# Altium footprint library PCB1.PcbLib: 98 footprints (part 2 of 7)
Each footprint in its own frame and in the unit in brackets; x right, y up, seen from the top. Pads: shape width x height; smd on the part's side, far side on the other; paste and mask are expansions set on the pad; w line width, h text height; cw(c..) or ccw(c..) is an arc to the next point about the centre after c.
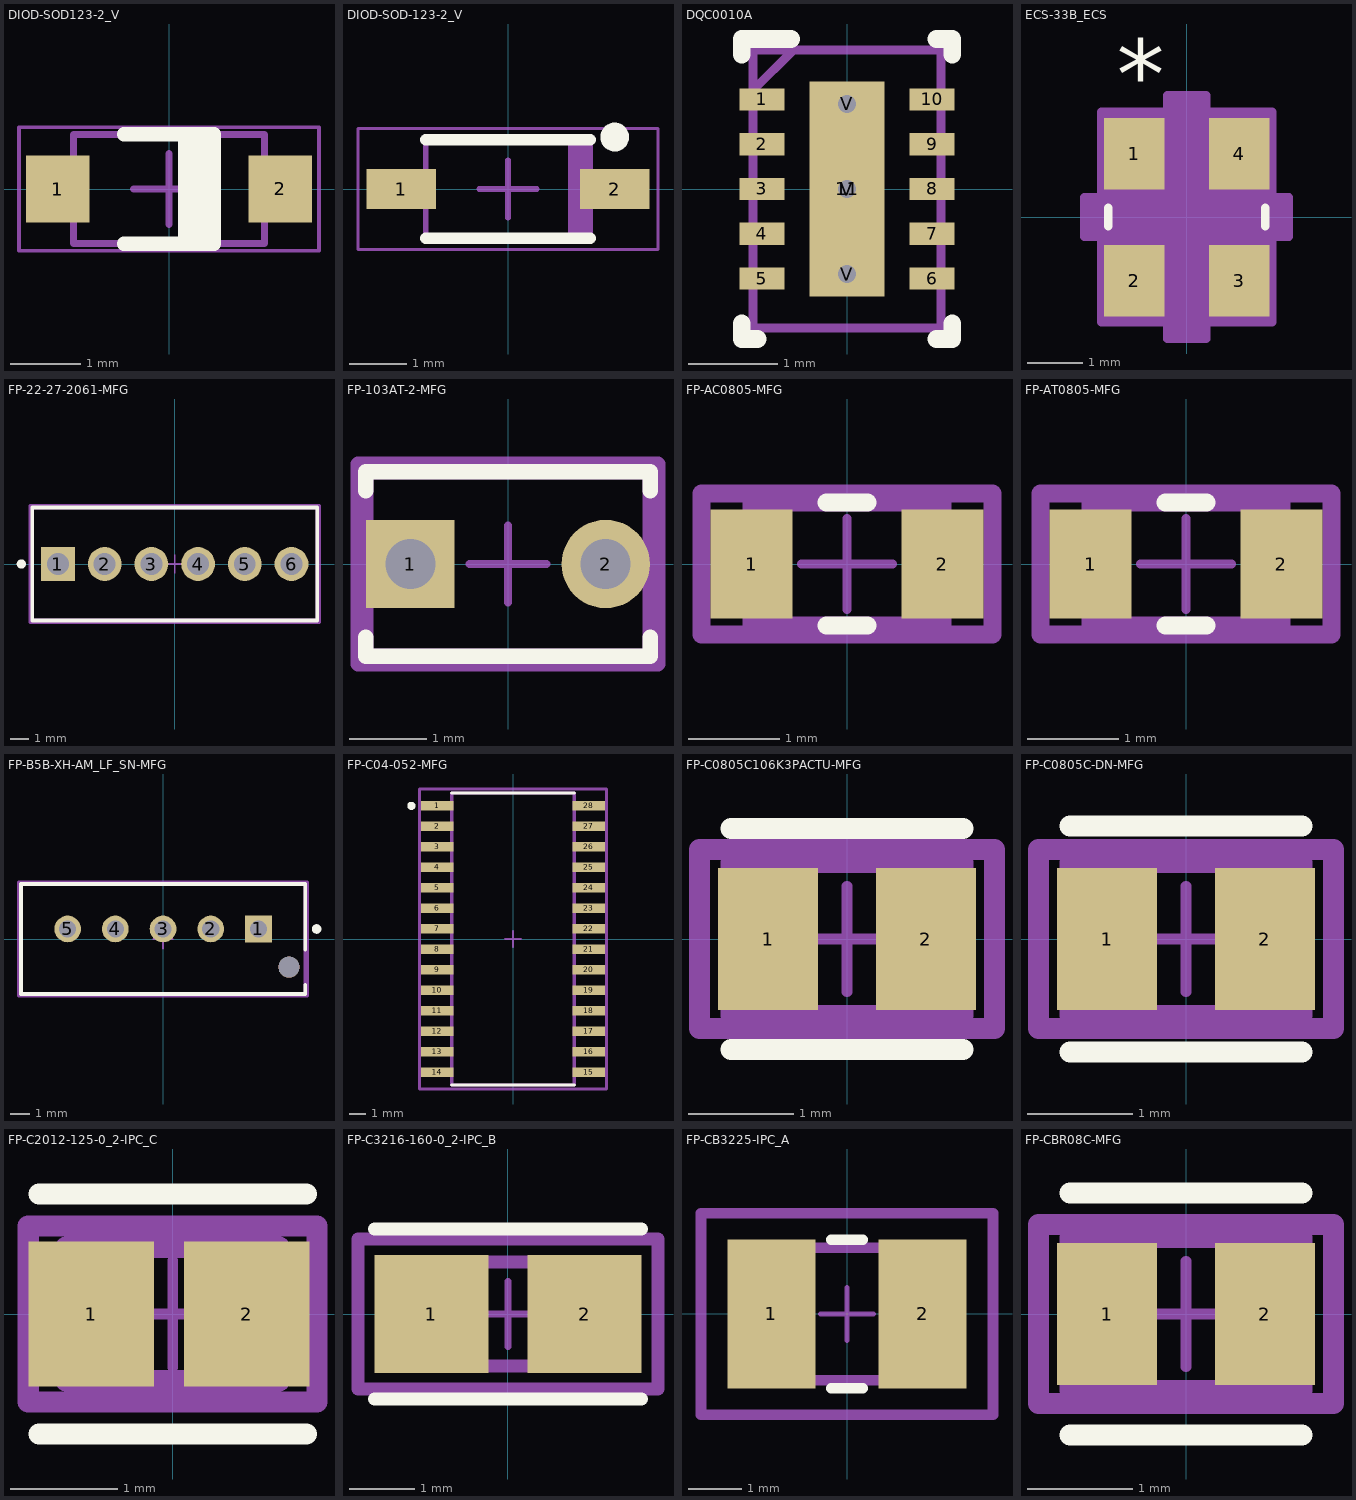
[diagram p1: the footprints below, top view; thin cyan lines are the x and y axes]

## DIOD-SOD123-2_V [mm]
pads (2):
  rect 0.9x0.95 smd: 1(-1.575,0) 2(1.575,0)
Top Overlay:
  rectangle: 0.127,-0.825 0.635,0.762
  lines w0.2: -0.635,-0.775 0.635,-0.775 0.635,0.775 -0.635,0.775
Top 3D Body:
  lines w0.1: -1.35,-0.775 1.35,-0.775 1.35,0.775 -1.35,0.775 -1.35,-0.775
Top Courtyard:
  lines w0.05: -2.125,-0.875 2.125,-0.875 2.125,0.875 -2.125,0.875 -2.125,-0.875
  lines w0.1: -0.5,0 0.5,0 ; 0,-0.5 0,0.5
3D body: height 1.45, standoff 0, extent -1.35,-0.775 1.35,0.775

## DIOD-SOD-123-2_V [mm]
pads (2):
  rect 1.2x0.7 smd: 1(-1.85,0) 2(1.85,0)
Top Overlay:
  circle w0.25: c1.85,0.9 r0.125
  lines w0.2: -1.425,-0.85 1.425,-0.85 ; -1.425,0.85 1.425,0.85
Top 3D Body:
  rectangle: 1.042,-0.85 1.425,0.85
  lines w0.1: -1.425,-0.85 1.425,-0.85 1.425,0.85 -1.425,0.85 -1.425,-0.85
Top Courtyard:
  lines w0.05: -2.6,-1.05 2.6,-1.05 2.6,1.05 -2.6,1.05 -2.6,-1.05
  lines w0.1: -0.5,0 0.5,0 ; 0,-0.5 0,0.5
3D body: height 1.45, standoff 0, extent -1.425,-0.85 1.425,0.85

## DQC0010A [mm]
pads (14):
  rect 0.5x0.25 smd paste+0 mask+0.051: 1(-0.95,1) 2(-0.95,0.5) 3(-0.95,0) 4(-0.95,-0.5) 5(-0.95,-1) 6(0.95,-1) 7(0.95,-0.5) 8(0.95,0) 9(0.95,0.5) 10(0.95,1)
  rect 0.84x2.4 smd paste-0.42 mask+0.051: 11(0,0)
  round 0.5 hole 0.203 paste-2539.97 mask+0.051: V(0,-0.95) V(0,0) V(0,0.95)
Top Overlay:
  lines w0.2: -1.175,-1.5 -1.175,-1.675 -1,-1.675 ; -1.175,1.5 -1.175,1.675 -0.625,1.675 ; 1,-1.675 1.175,-1.675 1.175,-1.5 ; 1,1.675 1.175,1.675 1.175,1.5
Top Paste:
  region: -0.399,0.139 -0.4,0.148 -0.4,1.132 -0.399,1.141 -0.396,1.15 -0.392,1.159 -0.386,1.166 -0.379,1.172 -0.37,1.176 -0.361,1.179 -0.352,1.18 0.352,1.18 0.361,1.179 0.37,1.176 0.379,1.172 0.386,1.166 0.392,1.159 0.396,1.15 0.399,1.141 0.4,1.132 0.4,0.148 0.399,0.139 0.396,0.13 0.392,0.121 0.386,0.114 0.379,0.108 0.37,0.104 0.361,0.101 0.352,0.1 -0.352,0.1 -0.361,0.101 -0.37,0.104 -0.379,0.108 -0.386,0.114 -0.392,0.121 -0.396,0.13
  region: -0.399,-1.141 -0.4,-1.132 -0.4,-0.148 -0.399,-0.139 -0.396,-0.13 -0.392,-0.121 -0.386,-0.114 -0.379,-0.108 -0.37,-0.104 -0.361,-0.101 -0.352,-0.1 0.352,-0.1 0.361,-0.101 0.37,-0.104 0.379,-0.108 0.386,-0.114 0.392,-0.121 0.396,-0.13 0.399,-0.139 0.4,-0.148 0.4,-1.132 0.399,-1.141 0.396,-1.15 0.392,-1.159 0.386,-1.166 0.379,-1.172 0.37,-1.176 0.361,-1.179 0.352,-1.18 -0.352,-1.18 -0.361,-1.179 -0.37,-1.176 -0.379,-1.172 -0.386,-1.166 -0.392,-1.159 -0.396,-1.15
Top 3D Body:
  lines w0.1: -1.05,1.1 -0.6,1.55 ; -1.05,-1.55 1.05,-1.55 1.05,1.55 -1.05,1.55 -1.05,-1.55
3D body "TPS62177DQCR.step": height 0.8, standoff 0, extent -1,-1.5 1,1.5

## ECS-33B_ECS [mm]
pads (4):
  rect 1.092x1.295 smd paste+0 mask+0: 1(-0.95,1.15) 2(-0.95,-1.15) 3(0.95,-1.15) 4(0.95,1.15)
Top Overlay:
  lines w0.152: -1.422,-0.17 -1.422,0.17 ; 1.422,-0.17 1.422,0.17
  text "*" at -1.268,1.956 h1.27
Top 3D Body:
  lines w0.025: -1.295,0.381 -0.025,1.651 ; -1.295,-1.651 -1.295,1.651 1.295,1.651 1.295,-1.651 -1.295,-1.651
Top Courtyard:
  region: -0.381,-1.905 -1.575,-1.905 -1.575,-0.356 -1.88,-0.356 -1.88,0.356 -1.575,0.356 -1.575,1.905 -0.381,1.905 -0.381,2.21 0.33,2.21 0.33,1.905 1.524,1.905 1.524,0.356 1.829,0.356 1.829,-0.356 1.524,-0.356 1.524,-1.905 0.33,-1.905 0.33,-2.21 -0.381,-2.21
  lines w0.152: -1.854,-0.356 -1.854,0.356 -1.549,0.356 -1.549,1.905 -0.356,1.905 -0.356,2.21 0.356,2.21 0.356,1.905 1.549,1.905 1.549,0.356 1.854,0.356 1.854,-0.356 1.549,-0.356 1.549,-1.905 0.356,-1.905 0.356,-2.21 -0.356,-2.21 -0.356,-1.905 -1.549,-1.905 -1.549,-0.356 -1.854,-0.356
3D body "ECS-320-8-33B-7KM-TR.STEP": height 0.8, standoff 0, extent -1.25,-1.6 1.25,1.6

## FP-22-27-2061-MFG [mm]
pads (6):
  rect 1.84x1.84 hole 1.19 paste-2539.97 mask+0: 1(-6.35,0)
  round 1.84 hole 1.19 paste-2539.97 mask+0: 2(-3.81,0) 3(-1.27,0) 4(1.27,0) 5(3.81,0) 6(6.35,0)
Top Overlay:
  circle w0.25: c-8.345,0 r0.125
  lines w0.2: -7.745,-3.075 -7.745,3.075 7.745,3.075 7.745,-3.075 -7.745,-3.075
Top Assembly:
  lines w0.2: -7.845,-3.175 7.845,-3.175 7.845,3.175 -7.845,3.175 -7.845,-3.175
Top 3D Body:
  lines w0.2: -7.745,-3.075 7.745,-3.075 7.745,3.075 -7.745,3.075 -7.745,-3.075
Top Courtyard:
  lines w0.2: -7.845,-3.175 7.845,-3.175 7.845,3.175 -7.845,3.175 -7.845,-3.175
Top Component Center:
  lines w0.1: -0.5,0 0.5,0 ; 0,-0.5 0,0.5
3D body "Conn_Molex_22-27-2061_eec.STEP": height 12.05, standoff -3.56, extent -7.623,-2.9 7.62,2.901

## FP-103AT-2-MFG [mm]
pads (2):
  rect 1.15x1.15 hole 0.65 paste-2539.97 mask+0: 1(-1.27,0)
  round 1.15 hole 0.65 paste-2539.97 mask+0: 2(1.27,0)
Top Overlay:
  lines w0.2: -1.85,-0.95 -1.85,-1.2 1.85,-1.2 1.85,-0.95 ; -1.85,0.95 -1.85,1.2 1.85,1.2 1.85,0.95
Top Assembly:
  lines w0.2: -1.95,-1.3 -1.95,1.3 1.95,1.3 1.95,-1.3 -1.95,-1.3
Top 3D Body:
  lines w0.2: -1.85,-1.2 -1.85,1.2 1.85,1.2 1.85,-1.2 -1.85,-1.2
Top Courtyard:
  lines w0.2: -1.95,-1.3 -1.95,1.3 1.95,1.3 1.95,-1.3 -1.95,-1.3
Top Component Center:
  lines w0.1: -0.5,0 0.5,0 ; 0,-0.5 0,0.5
3D body "Res_Semitec_103AT-2_eec.STEP": height 0.25, standoff 0, extent -1.95,-1.3 1.95,1.3

## FP-AC0805-MFG [mm]
pads (2):
  rect 0.9x1.2 smd paste+0 mask+0: 1(-1.05,0) 2(1.05,0)
Top Overlay:
  lines w0.2: -0.225,-0.675 0.225,-0.675 ; -0.225,0.675 0.225,0.675
Top Assembly:
  lines w0.2: -1.6,-0.775 1.6,-0.775 1.6,0.775 -1.6,0.775 -1.6,-0.775
Top 3D Body:
  lines w0.2: -1.05,-0.675 1.05,-0.675 1.05,0.675 -1.05,0.675 -1.05,-0.675
Top Courtyard:
  lines w0.2: -1.6,-0.775 1.6,-0.775 1.6,0.775 -1.6,0.775 -1.6,-0.775
Top Component Center:
  lines w0.1: -0.5,0 0.5,0 ; 0,-0.5 0,0.5
3D body "Res_Yageo_AC0805FR-074R22L_eec.STEP": height 0.6, standoff 0, extent -1,-0.625 1,0.625

## FP-AT0805-MFG [mm]
pads (2):
  rect 0.9x1.2 smd paste+0 mask+0: 1(-1.05,0) 2(1.05,0)
Top Overlay:
  lines w0.2: -0.225,-0.675 0.225,-0.675 ; -0.225,0.675 0.225,0.675
Top Assembly:
  lines w0.2: -1.6,-0.775 1.6,-0.775 1.6,0.775 -1.6,0.775 -1.6,-0.775
Top 3D Body:
  lines w0.2: -1.05,-0.675 1.05,-0.675 1.05,0.675 -1.05,0.675 -1.05,-0.675
Top Courtyard:
  lines w0.2: -1.6,-0.775 1.6,-0.775 1.6,0.775 -1.6,0.775 -1.6,-0.775
Top Component Center:
  lines w0.1: -0.5,0 0.5,0 ; 0,-0.5 0,0.5
3D body "Res_Yageo_AT0805BRA0710KL_eec.STEP": height 0.25, standoff 0, extent -1.6,-0.775 1.6,0.775

## FP-B5B-XH-AM_LF_SN-MFG [mm]
pads (6):
  rect 1.4x1.4 hole 0.9 paste-2539.97 mask+0: 1(5,0.525)
  round 1.4 hole 0.9 paste-2539.97 mask+0: 2(2.5,0.525) 3(0,0.525) 4(-2.5,0.525) 5(-5,0.525)
  round 1.1 hole 1.1 unplated paste-2539.97 mask+0: ""(6.6,-1.475)
Top Overlay:
  circle w0.25: c8.05,0.525 r0.125
  lines w0.2: 7.45,-2.4 7.45,-2.875 -7.45,-2.875 -7.45,2.875 7.45,2.875 7.45,-0.55
Top Assembly:
  lines w0.2: -7.55,-2.975 -7.55,2.975 7.55,2.975 7.55,-2.975 -7.55,-2.975
Top 3D Body:
  lines w0.2: -7.45,-2.875 -7.45,2.875 7.45,2.875 7.45,-2.875 -7.45,-2.875
Top Courtyard:
  lines w0.2: -7.55,-2.975 -7.55,2.975 7.55,2.975 7.55,-2.975 -7.55,-2.975
Top Component Center:
  lines w0.1: -0.5,0 0.5,0 ; 0,-0.5 0,0.5
3D body "Conn_JST_B5B-XH-AM_LF_SN_eec.STEP": height 7, standoff -3.4, extent -7.45,-2.875 7.451,2.875

## FP-C04-052-MFG [mm]
pads (28):
  rect 2x0.6 smd paste+0 mask+0: 1(-4.7,8.255) 2(-4.7,6.985) 3(-4.7,5.715) 4(-4.7,4.445) 5(-4.7,3.175) 6(-4.7,1.905) 7(-4.7,0.635) 8(-4.7,-0.635) 9(-4.7,-1.905) 10(-4.7,-3.175) 11(-4.7,-4.445) 12(-4.7,-5.715) 13(-4.7,-6.985) 14(-4.7,-8.255) 15(4.7,-8.255) 16(4.7,-6.985) 17(4.7,-5.715) 18(4.7,-4.445) 19(4.7,-3.175) 20(4.7,-1.905) 21(4.7,-0.635) 22(4.7,0.635) 23(4.7,1.905) 24(4.7,3.175) 25(4.7,4.445) 26(4.7,5.715) 27(4.7,6.985) 28(4.7,8.255)
Top Overlay:
  circle w0.25: c-6.3,8.255 r0.125
  lines w0.2: -3.8,-9.05 3.8,-9.05 ; -3.8,9.05 3.8,9.05
Top Assembly:
  lines w0.2: -5.8,-9.3 5.8,-9.3 5.8,9.3 -5.8,9.3 -5.8,-9.3
Top 3D Body:
  lines w0.2: -3.8,-9.05 3.8,-9.05 3.8,9.05 -3.8,9.05 -3.8,-9.05
Top Courtyard:
  lines w0.2: -5.8,-9.3 5.8,-9.3 5.8,9.3 -5.8,9.3 -5.8,-9.3
Top Component Center:
  lines w0.1: -0.5,0 0.5,0 ; 0,-0.5 0,0.5
3D body "IC_Microchip_PIC32MX274F256BT-I-SO_eec.STEP": height 0.25, standoff 0, extent -5.8,-9.3 5.8,9.3

## FP-C0805C106K3PACTU-MFG [mm]
pads (2):
  rect 0.95x1.35 smd paste+0 mask+0: 1(-0.75,0) 2(0.75,0)
Top Overlay:
  lines w0.2: -1.1,-1.05 1.1,-1.05 ; -1.1,1.05 1.1,1.05
Top Assembly:
  lines w0.2: -1.4,-0.85 1.4,-0.85 1.4,0.85 -1.4,0.85 -1.4,-0.85
Top 3D Body:
  lines w0.2: -1.1,-0.725 1.1,-0.725 1.1,0.725 -1.1,0.725 -1.1,-0.725
Top Courtyard:
  lines w0.2: -1.4,-0.85 1.4,-0.85 1.4,0.85 -1.4,0.85 -1.4,-0.85
Top Component Center:
  lines w0.1: -0.5,0 0.5,0 ; 0,-0.5 0,0.5
3D body "Cap_KEMET_C0805C106K3PACTU_eec.STEP": height 0.25, standoff 0, extent -1.4,-0.85 1.4,0.85

## FP-C0805C-DN-MFG [mm]
pads (2):
  rect 0.95x1.35 smd paste+0 mask+0: 1(-0.75,0) 2(0.75,0)
Top Overlay:
  lines w0.2: -1.1,-1.075 1.1,-1.075 ; -1.1,1.075 1.1,1.075
Top Assembly:
  lines w0.2: -1.4,-0.85 -1.4,0.85 1.4,0.85 1.4,-0.85 -1.4,-0.85
Top 3D Body:
  lines w0.2: -1.1,-0.725 -1.1,0.725 1.1,0.725 1.1,-0.725 -1.1,-0.725
Top Courtyard:
  lines w0.2: -1.4,-0.85 -1.4,0.85 1.4,0.85 1.4,-0.85 -1.4,-0.85
Top Component Center:
  lines w0.1: -0.5,0 0.5,0 ; 0,-0.5 0,0.5
3D body "Cap_KEMET_C0805C472J3HAC_eec.STEP": height 0.25, standoff 0, extent -1.4,-0.85 1.4,0.85

## FP-C2012-125-0_2-IPC_C [mil]
pads (2):
  rect 46.38x53.39 smd paste+0 mask+0: 1(-30,0) 2(27.29,0)
Top Overlay:
  lines w7.87: -49.33,-44.29 49.33,-44.29 ; -49.33,44.29 49.33,44.29
Top Assembly:
  lines w7.87: -53.27,-32.48 -53.27,32.48 53.27,32.48 53.27,-32.48 -53.27,-32.48
Top 3D Body:
  lines w7.87: -39.37,-24.61 -39.37,24.61 39.37,24.61 39.37,-24.61 -39.37,-24.61
Top Courtyard:
  lines w7.87: -53.27,-32.48 -53.27,32.48 53.27,32.48 53.27,-32.48 -53.27,-32.48
Top Component Center:
  lines w3.94: -19.68,0 19.68,0 ; 0,-19.68 0,19.68
3D body "Cap_TDK_C2012X7R1E474K125AA_eec.STEP": height 10, standoff 0, extent -53.27,-32.48 53.27,32.48

## FP-C3216-160-0_2-IPC_B [mm]
pads (2):
  rect 1.754x1.806 smd paste+0 mask+0: 1(-1.176,0) 2(1.176,0)
Top Overlay:
  lines w0.2: -2.053,-1.303 2.053,-1.303 ; -2.053,1.303 2.053,1.303
Top Assembly:
  lines w0.2: -2.303,-1.153 2.303,-1.153 2.303,1.153 -2.303,1.153 -2.303,-1.153
Top 3D Body:
  lines w0.2: -1.6,-0.8 1.6,-0.8 1.6,0.8 -1.6,0.8 -1.6,-0.8
Top Courtyard:
  lines w0.2: -2.303,-1.153 2.303,-1.153 2.303,1.153 -2.303,1.153 -2.303,-1.153
Top Component Center:
  lines w0.1: -0.5,0 0.5,0 ; 0,-0.5 0,0.5
3D body "Cap_TDK_C3216X7R1C106M160AC_eec.STEP": height 0.25, standoff 0, extent -2.303,-1.153 2.303,1.153

## FP-CB3225-IPC_A [mm]
pads (2):
  rect 1.654x2.806 smd paste+0 mask+0: 1(-1.426,0) 2(1.426,0)
Top Overlay:
  lines w0.2: -0.299,-1.403 0.299,-1.403 ; -0.299,1.403 0.299,1.403
Top Assembly:
  lines w0.2: -2.753,-1.903 -2.753,1.903 2.753,1.903 2.753,-1.903 -2.753,-1.903
Top 3D Body:
  lines w0.2: -1.6,-1.25 -1.6,1.25 1.6,1.25 1.6,-1.25 -1.6,-1.25
Top Courtyard:
  lines w0.2: -2.753,-1.903 -2.753,1.903 2.753,1.903 2.753,-1.903 -2.753,-1.903
Top Component Center:
  lines w0.1: -0.5,0 0.5,0 ; 0,-0.5 0,0.5
3D body "Ind_Taiyo_Yuden_CBC3225T2R2MR_eec.STEP": height 0.25, standoff 0, extent -2.753,-1.903 2.753,1.903

## FP-CBR08C-MFG [mm]
pads (2):
  rect 0.95x1.35 smd paste+0 mask+0: 1(-0.75,0) 2(0.75,0)
Top Overlay:
  lines w0.2: -1.1,-1.15 1.1,-1.15 ; -1.1,1.15 1.1,1.15
Top Assembly:
  lines w0.2: -1.4,-0.85 -1.4,0.85 1.4,0.85 1.4,-0.85 -1.4,-0.85
Top 3D Body:
  lines w0.2: -1.1,-0.725 -1.1,0.725 1.1,0.725 1.1,-0.725 -1.1,-0.725
Top Courtyard:
  lines w0.2: -1.4,-0.85 -1.4,0.85 1.4,0.85 1.4,-0.85 -1.4,-0.85
Top Component Center:
  lines w0.1: -0.5,0 0.5,0 ; 0,-0.5 0,0.5
3D body "Cap_KEMET_CBR08C749C5GAC_eec.STEP": height 0.25, standoff 0, extent -1.4,-0.85 1.4,0.85